# Altium integrated library ALTIUM-WR-FPC-rev18c.IntLib: 212 symbols (part 1 of 2) (continued)
## 686124183822 (continued)
SMT ZIF Connectors WR-FPC, Vertical, Type A, pitch 1 mm, 24 pins; Part Number: 686124183822; Rated Current: 1 A; Contact Resistance: 30 mOhm; Withstanding Voltage: 250 VAC; Working Voltage: 125 VAC; Pin Number: 24; Pitch: 1 mm; Contact Design: Type A; ComponentLink1Description: Manufacturer; ComponentLink1URL: http://www.we-online.de; ComponentLink2Description: Datasheet; ComponentLink2URL: https://katalog.we-online.de/em/datasheet/686124183822.pdf; Published Date: August 2018; Publisher: Wurth Elektronik; Operating Temperature: -25 to 85 degC; Packaging: Tape and Reel; Mounting Technology: SMT; Orientation: Vertical
footprint 686124183822
pins: 1, 2, 3, 4, 5, 6, 7, 8, 9, 10, 11, 12, 13, 14, 15, 16, 17, 18, 19, 20, 21, 22, 23, 24, MP1, MP2, MP3, MP4

## 686126148922
designator J?
SMT ZIF Connectors Hinge Type WR-FPC, Horizontal, Bottom Contact, pitch 1 mm, 26 pins; Part Number: 686126148922; Rated Current: 1 A; Contact Resistance: 50 mOhm; Withstanding Voltage: 500 VAC; Working Voltage: 100 VAC; Pin Number: 26; Pitch: 1 mm; ComponentLink1Description: Manufacturer; ComponentLink1URL: http://www.we-online.de; ComponentLink2Description: Datasheet; ComponentLink2URL: https://katalog.we-online.de/em/datasheet/686126148922.pdf; Published Date: August 2018; Publisher: Wurth Elektronik; Operating Temperature: -40 to 105 degC; Packaging: Tape and Reel; Mounting Technology: SMT; Orientation: Horizontal; Contact Design: Bottom Contact
footprint 686126148922
pins: 1, 2, 3, 4, 5, 6, 7, 8, 9, 10, 11, 12, 13, 14, 15, 16, 17, 18, 19, 20, 21, 22, 23, 24, 25, 26, MP1, MP2

## 686128148922
designator J?
SMT ZIF Connectors Hinge Type WR-FPC, Horizontal, Bottom Contact, pitch 1 mm, 28 pins; Part Number: 686128148922; Rated Current: 1 A; Contact Resistance: 50 mOhm; Withstanding Voltage: 500 VAC; Working Voltage: 100 VAC; Pin Number: 28; Pitch: 1 mm; ComponentLink1Description: Manufacturer; ComponentLink1URL: http://www.we-online.de; ComponentLink2Description: Datasheet; ComponentLink2URL: https://katalog.we-online.de/em/datasheet/686128148922.pdf; Published Date: August 2018; Publisher: Wurth Elektronik; Operating Temperature: -40 to 105 degC; Packaging: Tape and Reel; Mounting Technology: SMT; Orientation: Horizontal; Contact Design: Bottom Contact
footprint 686128148922
pins: 1, 2, 3, 4, 5, 6, 7, 8, 9, 10, 11, 12, 13, 14, 15, 16, 17, 18, 19, 20, 21, 22, 23, 24, 25, 26, 27, 28, MP1, MP2

## 686130148922
designator J?
SMT ZIF Connectors Hinge Type WR-FPC, Horizontal, Bottom Contact, pitch 1 mm, 30 pins; Part Number: 686130148922; Rated Current: 1 A; Contact Resistance: 50 mOhm; Withstanding Voltage: 500 VAC; Working Voltage: 100 VAC; Pin Number: 30; Pitch: 1 mm; ComponentLink1Description: Manufacturer; ComponentLink1URL: http://www.we-online.de; ComponentLink2Description: Datasheet; ComponentLink2URL: https://katalog.we-online.de/em/datasheet/686130148922.pdf; Published Date: August 2018; Publisher: Wurth Elektronik; Operating Temperature: -40 to 105 degC; Packaging: Tape and Reel; Mounting Technology: SMT; Orientation: Horizontal; Contact Design: Bottom Contact
footprint 686130148922
pins: 1, 2, 3, 4, 5, 6, 7, 8, 9, 10, 11, 12, 13, 14, 15, 16, 17, 18, 19, 20, 21, 22, 23, 24, 25, 26, 27, 28, 29, 30, MP1, MP2


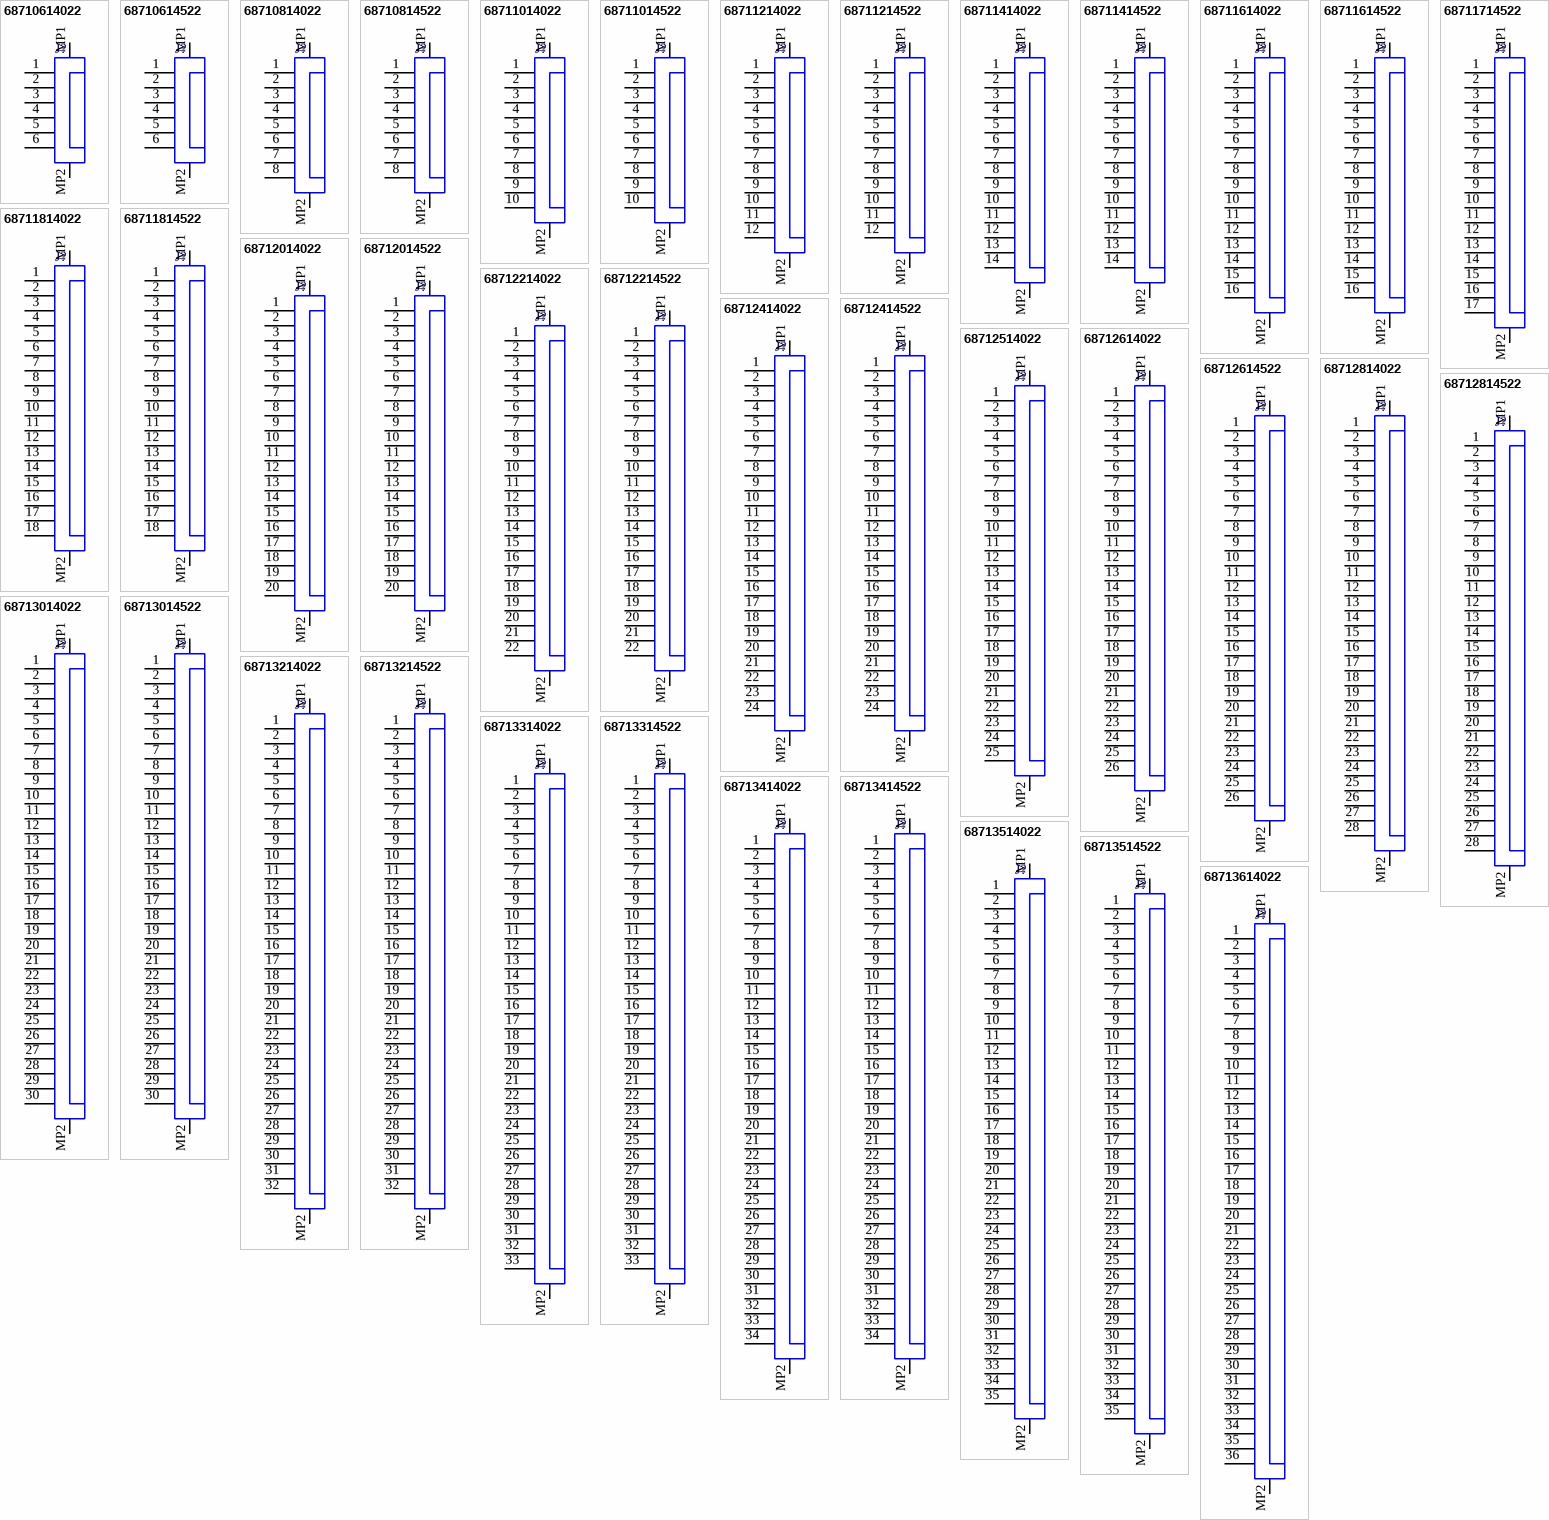
[diagram p2: symbols 68710614022 to 68713614022]

## 68710614022
designator J?
SMT ZIF Connectors WR-FPC, Horizontal, Top Contact, pitch 0.5 mm, 6 pins; Part Number: 68710614022; Rated Current: 0.5 A; Contact Resistance: 20 mOhm; Withstanding Voltage: 250 VAC; Working Voltage: 50 VAC; Pin Number: 6; Pitch: 0.5 mm; ComponentLink1Description: Manufacturer; ComponentLink1URL: http://www.we-online.de; ComponentLink2Description: Datasheet; ComponentLink2URL: https://katalog.we-online.de/em/datasheet/68710614022.pdf; Published Date: August 2018; Publisher: Wurth Elektronik; Operating Temperature: -25 to 85 degC; Packaging: Tape and Reel; Mounting Technology: SMT; Orientation: Horizontal; Contact Design: Top Contact
footprint 68710614022
pins: 1, 2, 3, 4, 5, 6, MP1, MP2

## 68710614522
designator J?
SMT ZIF Connectors WR-FPC, Horizontal, Bottom Contact, pitch 0.5 mm, 6 pins; Part Number: 68710614522; Rated Current: 0.5 A; Contact Resistance: 20 mOhm; Withstanding Voltage: 250 VAC; Working Voltage: 50 VAC; Pin Number: 6; Pitch: 0.5 mm; ComponentLink1Description: Manufacturer; ComponentLink1URL: http://www.we-online.de; ComponentLink2Description: Datasheet; ComponentLink2URL: https://katalog.we-online.de/em/datasheet/68710614522.pdf; Published Date: August 2018; Publisher: Wurth Elektronik; Operating Temperature: -25 to 85 degC; Packaging: Tape and Reel; Mounting Technology: SMT; Orientation: Horizontal; Contact Design: Bottom Contact
footprint 68710614522
pins: 1, 2, 3, 4, 5, 6, MP1, MP2

## 68710814022
designator J?
SMT ZIF Connectors WR-FPC, Horizontal, Top Contact, pitch 0.5 mm, 8 pins; Part Number: 68710814022; Rated Current: 0.5 A; Contact Resistance: 20 mOhm; Withstanding Voltage: 250 VAC; Working Voltage: 50 VAC; Pin Number: 8; Pitch: 0.5 mm; ComponentLink1Description: Manufacturer; ComponentLink1URL: http://www.we-online.de; ComponentLink2Description: Datasheet; ComponentLink2URL: https://katalog.we-online.de/em/datasheet/68710814022.pdf; Published Date: August 2018; Publisher: Wurth Elektronik; Operating Temperature: -25 to 85 degC; Packaging: Tape and Reel; Mounting Technology: SMT; Orientation: Horizontal; Contact Design: Top Contact
footprint 68710814022
pins: 1, 2, 3, 4, 5, 6, 7, 8, MP1, MP2

## 68710814522
designator J?
SMT ZIF Connectors WR-FPC, Horizontal, Bottom Contact, pitch 0.5 mm, 8 pins; Part Number: 68710814522; Rated Current: 0.5 A; Contact Resistance: 20 mOhm; Withstanding Voltage: 250 VAC; Working Voltage: 50 VAC; Pin Number: 8; Pitch: 0.5 mm; ComponentLink1Description: Manufacturer; ComponentLink1URL: http://www.we-online.de; ComponentLink2Description: Datasheet; ComponentLink2URL: https://katalog.we-online.de/em/datasheet/68710814522.pdf; Published Date: August 2018; Publisher: Wurth Elektronik; Operating Temperature: -25 to 85 degC; Packaging: Tape and Reel; Mounting Technology: SMT; Orientation: Horizontal; Contact Design: Bottom Contact
footprint 68710814522
pins: 1, 2, 3, 4, 5, 6, 7, 8, MP1, MP2

## 68711014022
designator J?
SMT ZIF Connectors WR-FPC, Horizontal, Top Contact, pitch 0.5 mm, 10 pins; Part Number: 68711014022; Rated Current: 0.5 A; Contact Resistance: 20 mOhm; Withstanding Voltage: 250 VAC; Working Voltage: 50 VAC; Pin Number: 10; Pitch: 0.5 mm; ComponentLink1Description: Manufacturer; ComponentLink1URL: http://www.we-online.de; ComponentLink2Description: Datasheet; ComponentLink2URL: https://katalog.we-online.de/em/datasheet/68711014022.pdf; Published Date: August 2018; Publisher: Wurth Elektronik; Operating Temperature: -25 to 85 degC; Packaging: Tape and Reel; Mounting Technology: SMT; Orientation: Horizontal; Contact Design: Top Contact
footprint 68711014022
pins: 1, 2, 3, 4, 5, 6, 7, 8, 9, 10, MP1, MP2

## 68711014522
designator J?
SMT ZIF Connectors WR-FPC, Horizontal, Bottom Contact, pitch 0.5 mm, 10 pins; Part Number: 68711014522; Rated Current: 0.5 A; Contact Resistance: 20 mOhm; Withstanding Voltage: 250 VAC; Working Voltage: 50 VAC; Pin Number: 10; Pitch: 0.5 mm; ComponentLink1Description: Manufacturer; ComponentLink1URL: http://www.we-online.de; ComponentLink2Description: Datasheet; ComponentLink2URL: https://katalog.we-online.de/em/datasheet/68711014522.pdf; Published Date: August 2018; Publisher: Wurth Elektronik; Operating Temperature: -25 to 85 degC; Packaging: Tape and Reel; Mounting Technology: SMT; Orientation: Horizontal; Contact Design: Bottom Contact
footprint 68711014522
pins: 1, 2, 3, 4, 5, 6, 7, 8, 9, 10, MP1, MP2

## 68711214022
designator J?
SMT ZIF Connectors WR-FPC, Horizontal, Top Contact, pitch 0.5 mm, 12 pins; Part Number: 68711214022; Rated Current: 0.5 A; Contact Resistance: 20 mOhm; Withstanding Voltage: 250 VAC; Working Voltage: 50 VAC; Pin Number: 12; Pitch: 0.5 mm; ComponentLink1Description: Manufacturer; ComponentLink1URL: http://www.we-online.de; ComponentLink2Description: Datasheet; ComponentLink2URL: https://katalog.we-online.de/em/datasheet/68711214022.pdf; Published Date: August 2018; Publisher: Wurth Elektronik; Operating Temperature: -25 to 85 degC; Packaging: Tape and Reel; Mounting Technology: SMT; Orientation: Horizontal; Contact Design: Top Contact
footprint 68711214022
pins: 1, 2, 3, 4, 5, 6, 7, 8, 9, 10, 11, 12, MP1, MP2

## 68711214522
designator J?
SMT ZIF Connectors WR-FPC, Horizontal, Bottom Contact, pitch 0.5 mm, 12 pins; Part Number: 68711214522; Rated Current: 0.5 A; Contact Resistance: 20 mOhm; Withstanding Voltage: 250 VAC; Working Voltage: 50 VAC; Pin Number: 12; Pitch: 0.5 mm; ComponentLink1Description: Manufacturer; ComponentLink1URL: http://www.we-online.de; ComponentLink2Description: Datasheet; ComponentLink2URL: https://katalog.we-online.de/em/datasheet/68711214522.pdf; Published Date: August 2018; Publisher: Wurth Elektronik; Operating Temperature: -25 to 85 degC; Packaging: Tape and Reel; Mounting Technology: SMT; Orientation: Horizontal; Contact Design: Bottom Contact
footprint 68711214522
pins: 1, 2, 3, 4, 5, 6, 7, 8, 9, 10, 11, 12, MP1, MP2

## 68711414022
designator J?
SMT ZIF Connectors WR-FPC, Horizontal, Top Contact, pitch 0.5 mm, 14 pins; Part Number: 68711414022; Rated Current: 0.5 A; Contact Resistance: 20 mOhm; Withstanding Voltage: 250 VAC; Working Voltage: 50 VAC; Pin Number: 14; Pitch: 0.5 mm; ComponentLink1Description: Manufacturer; ComponentLink1URL: http://www.we-online.de; ComponentLink2Description: Datasheet; ComponentLink2URL: https://katalog.we-online.de/em/datasheet/68711414022.pdf; Published Date: August 2018; Publisher: Wurth Elektronik; Operating Temperature: -25 to 85 degC; Packaging: Tape and Reel; Mounting Technology: SMT; Orientation: Horizontal; Contact Design: Top Contact
footprint 68711414022
pins: 1, 2, 3, 4, 5, 6, 7, 8, 9, 10, 11, 12, 13, 14, MP1, MP2

## 68711414522
designator J?
SMT ZIF Connectors WR-FPC, Horizontal, Bottom Contact, pitch 0.5 mm, 14 pins; Part Number: 68711414522; Rated Current: 0.5 A; Contact Resistance: 20 mOhm; Withstanding Voltage: 250 VAC; Working Voltage: 50 VAC; Pin Number: 14; Pitch: 0.5 mm; ComponentLink1Description: Manufacturer; ComponentLink1URL: http://www.we-online.de; ComponentLink2Description: Datasheet; ComponentLink2URL: https://katalog.we-online.de/em/datasheet/68711414522.pdf; Published Date: August 2018; Publisher: Wurth Elektronik; Operating Temperature: -25 to 85 degC; Packaging: Tape and Reel; Mounting Technology: SMT; Orientation: Horizontal; Contact Design: Bottom Contact
footprint 68711414522
pins: 1, 2, 3, 4, 5, 6, 7, 8, 9, 10, 11, 12, 13, 14, MP1, MP2

## 68711614022
designator J?
SMT ZIF Connectors WR-FPC, Horizontal, Top Contact, pitch 0.5 mm, 16 pins; Part Number: 68711614022; Rated Current: 0.5 A; Contact Resistance: 20 mOhm; Withstanding Voltage: 250 VAC; Working Voltage: 50 VAC; Pin Number: 16; Pitch: 0.5 mm; ComponentLink1Description: Manufacturer; ComponentLink1URL: http://www.we-online.de; ComponentLink2Description: Datasheet; ComponentLink2URL: https://katalog.we-online.de/em/datasheet/68711614022.pdf; Published Date: August 2018; Publisher: Wurth Elektronik; Operating Temperature: -25 to 85 degC; Packaging: Tape and Reel; Mounting Technology: SMT; Orientation: Horizontal; Contact Design: Top Contact
footprint 68711614022
pins: 1, 2, 3, 4, 5, 6, 7, 8, 9, 10, 11, 12, 13, 14, 15, 16, MP1, MP2

## 68711614522
designator J?
SMT ZIF Connectors WR-FPC, Horizontal, Bottom Contact, pitch 0.5 mm, 16 pins; Part Number: 68711614522; Rated Current: 0.5 A; Contact Resistance: 20 mOhm; Withstanding Voltage: 250 VAC; Working Voltage: 50 VAC; Pin Number: 16; Pitch: 0.5 mm; ComponentLink1Description: Manufacturer; ComponentLink1URL: http://www.we-online.de; ComponentLink2Description: Datasheet; ComponentLink2URL: https://katalog.we-online.de/em/datasheet/68711614522.pdf; Published Date: August 2018; Publisher: Wurth Elektronik; Operating Temperature: -25 to 85 degC; Packaging: Tape and Reel; Mounting Technology: SMT; Orientation: Horizontal; Contact Design: Bottom Contact
footprint 68711614522
pins: 1, 2, 3, 4, 5, 6, 7, 8, 9, 10, 11, 12, 13, 14, 15, 16, MP1, MP2

## 68711714522
designator J?
SMT ZIF Connectors WR-FPC, Horizontal, Bottom Contact, pitch 0.5 mm, 17 pins; Part Number: 68711714522; Rated Current: 0.5 A; Contact Resistance: 20 mOhm; Withstanding Voltage: 250 VAC; Working Voltage: 50 VAC; Pin Number: 17; Pitch: 0.5 mm; ComponentLink1Description: Manufacturer; ComponentLink1URL: http://www.we-online.de; ComponentLink2Description: Datasheet; ComponentLink2URL: https://katalog.we-online.de/em/datasheet/68711714522.pdf; Published Date: August 2018; Publisher: Wurth Elektronik; Operating Temperature: -25 to 85 degC; Packaging: Tape and Reel; Mounting Technology: SMT; Orientation: Horizontal; Contact Design: Bottom Contact
footprint 68711714522
pins: 1, 2, 3, 4, 5, 6, 7, 8, 9, 10, 11, 12, 13, 14, 15, 16, 17, MP1, MP2

## 68711814022
designator J?
SMT ZIF Connectors WR-FPC, Horizontal, Top Contact, pitch 0.5 mm, 18 pins; Part Number: 68711814022; Rated Current: 0.5 A; Contact Resistance: 20 mOhm; Withstanding Voltage: 250 VAC; Working Voltage: 50 VAC; Pin Number: 18; Pitch: 0.5 mm; ComponentLink1Description: Manufacturer; ComponentLink1URL: http://www.we-online.de; ComponentLink2Description: Datasheet; ComponentLink2URL: https://katalog.we-online.de/em/datasheet/68711814022.pdf; Published Date: August 2018; Publisher: Wurth Elektronik; Operating Temperature: -25 to 85 degC; Packaging: Tape and Reel; Mounting Technology: SMT; Orientation: Horizontal; Contact Design: Top Contact
footprint 68711814022
pins: 1, 2, 3, 4, 5, 6, 7, 8, 9, 10, 11, 12, 13, 14, 15, 16, 17, 18, MP1, MP2

## 68711814522
designator J?
SMT ZIF Connectors WR-FPC, Horizontal, Bottom Contact, pitch 0.5 mm, 18 pins; Part Number: 68711814522; Rated Current: 0.5 A; Contact Resistance: 20 mOhm; Withstanding Voltage: 250 VAC; Working Voltage: 50 VAC; Pin Number: 18; Pitch: 0.5 mm; ComponentLink1Description: Manufacturer; ComponentLink1URL: http://www.we-online.de; ComponentLink2Description: Datasheet; ComponentLink2URL: https://katalog.we-online.de/em/datasheet/68711814522.pdf; Published Date: August 2018; Publisher: Wurth Elektronik; Operating Temperature: -25 to 85 degC; Packaging: Tape and Reel; Mounting Technology: SMT; Orientation: Horizontal; Contact Design: Bottom Contact
footprint 68711814522
pins: 1, 2, 3, 4, 5, 6, 7, 8, 9, 10, 11, 12, 13, 14, 15, 16, 17, 18, MP1, MP2

## 68712014022
designator J?
SMT ZIF Connectors WR-FPC, Horizontal, Top Contact, pitch 0.5 mm, 20 pins; Part Number: 68712014022; Rated Current: 0.5 A; Contact Resistance: 20 mOhm; Withstanding Voltage: 250 VAC; Working Voltage: 50 VAC; Pin Number: 20; Pitch: 0.5 mm; ComponentLink1Description: Manufacturer; ComponentLink1URL: http://www.we-online.de; ComponentLink2Description: Datasheet; ComponentLink2URL: https://katalog.we-online.de/em/datasheet/68712014022.pdf; Published Date: August 2018; Publisher: Wurth Elektronik; Operating Temperature: -25 to 85 degC; Packaging: Tape and Reel; Mounting Technology: SMT; Orientation: Horizontal; Contact Design: Top Contact
footprint 68712014022
pins: 1, 2, 3, 4, 5, 6, 7, 8, 9, 10, 11, 12, 13, 14, 15, 16, 17, 18, 19, 20, MP1, MP2

## 68712014522
designator J?
SMT ZIF Connectors WR-FPC, Horizontal, Bottom Contact, pitch 0.5 mm, 20 pins; Part Number: 68712014522; Rated Current: 0.5 A; Contact Resistance: 20 mOhm; Withstanding Voltage: 250 VAC; Working Voltage: 50 VAC; Pin Number: 20; Pitch: 0.5 mm; ComponentLink1Description: Manufacturer; ComponentLink1URL: http://www.we-online.de; ComponentLink2Description: Datasheet; ComponentLink2URL: https://katalog.we-online.de/em/datasheet/68712014522.pdf; Published Date: August 2018; Publisher: Wurth Elektronik; Operating Temperature: -25 to 85 degC; Packaging: Tape and Reel; Mounting Technology: SMT; Orientation: Horizontal; Contact Design: Bottom Contact
footprint 68712014522
pins: 1, 2, 3, 4, 5, 6, 7, 8, 9, 10, 11, 12, 13, 14, 15, 16, 17, 18, 19, 20, MP1, MP2

## 68712214022
designator J?
SMT ZIF Connectors WR-FPC, Horizontal, Top Contact, pitch 0.5 mm, 22 pins; Part Number: 68712214022; Rated Current: 0.5 A; Contact Resistance: 20 mOhm; Withstanding Voltage: 250 VAC; Working Voltage: 50 VAC; Pin Number: 22; Pitch: 0.5 mm; ComponentLink1Description: Manufacturer; ComponentLink1URL: http://www.we-online.de; ComponentLink2Description: Datasheet; ComponentLink2URL: https://katalog.we-online.de/em/datasheet/68712214022.pdf; Published Date: August 2018; Publisher: Wurth Elektronik; Operating Temperature: -25 to 85 degC; Packaging: Tape and Reel; Mounting Technology: SMT; Orientation: Horizontal; Contact Design: Top Contact
footprint 68712214022
pins: 1, 2, 3, 4, 5, 6, 7, 8, 9, 10, 11, 12, 13, 14, 15, 16, 17, 18, 19, 20, 21, 22, MP1, MP2

## 68712214522
designator J?
SMT ZIF Connectors WR-FPC, Horizontal, Bottom Contact, pitch 0.5 mm, 22 pins; Part Number: 68712214522; Rated Current: 0.5 A; Contact Resistance: 20 mOhm; Withstanding Voltage: 250 VAC; Working Voltage: 50 VAC; Pin Number: 22; Pitch: 0.5 mm; ComponentLink1Description: Manufacturer; ComponentLink1URL: http://www.we-online.de; ComponentLink2Description: Datasheet; ComponentLink2URL: https://katalog.we-online.de/em/datasheet/68712214522.pdf; Published Date: August 2018; Publisher: Wurth Elektronik; Operating Temperature: -25 to 85 degC; Packaging: Tape and Reel; Mounting Technology: SMT; Orientation: Horizontal; Contact Design: Bottom Contact
footprint 68712214522
pins: 1, 2, 3, 4, 5, 6, 7, 8, 9, 10, 11, 12, 13, 14, 15, 16, 17, 18, 19, 20, 21, 22, MP1, MP2

## 68712414022
designator J?
SMT ZIF Connectors WR-FPC, Horizontal, Top Contact, pitch 0.5 mm, 24 pins; Part Number: 68712414022; Rated Current: 0.5 A; Contact Resistance: 20 mOhm; Withstanding Voltage: 250 VAC; Working Voltage: 50 VAC; Pin Number: 24; Pitch: 0.5 mm; ComponentLink1Description: Manufacturer; ComponentLink1URL: http://www.we-online.de; ComponentLink2Description: Datasheet; ComponentLink2URL: https://katalog.we-online.de/em/datasheet/68712414022.pdf; Published Date: August 2018; Publisher: Wurth Elektronik; Operating Temperature: -25 to 85 degC; Packaging: Tape and Reel; Mounting Technology: SMT; Orientation: Horizontal; Contact Design: Top Contact
footprint 68712414022
pins: 1, 2, 3, 4, 5, 6, 7, 8, 9, 10, 11, 12, 13, 14, 15, 16, 17, 18, 19, 20, 21, 22, 23, 24, MP1, MP2

## 68712414522
designator J?
SMT ZIF Connectors WR-FPC, Horizontal, Bottom Contact, pitch 0.5 mm, 24 pins; Part Number: 68712414522; Rated Current: 0.5 A; Contact Resistance: 20 mOhm; Withstanding Voltage: 250 VAC; Working Voltage: 50 VAC; Pin Number: 24; Pitch: 0.5 mm; ComponentLink1Description: Manufacturer; ComponentLink1URL: http://www.we-online.de; ComponentLink2Description: Datasheet; ComponentLink2URL: https://katalog.we-online.de/em/datasheet/68712414522.pdf; Published Date: August 2018; Publisher: Wurth Elektronik; Operating Temperature: -25 to 85 degC; Packaging: Tape and Reel; Mounting Technology: SMT; Orientation: Horizontal; Contact Design: Bottom Contact
footprint 68712414522
pins: 1, 2, 3, 4, 5, 6, 7, 8, 9, 10, 11, 12, 13, 14, 15, 16, 17, 18, 19, 20, 21, 22, 23, 24, MP1, MP2

## 68712514022
designator J?
SMT ZIF Connectors WR-FPC, Horizontal, Top Contact, pitch 0.5 mm, 25 pins; Part Number: 68712514022; Rated Current: 0.5 A; Contact Resistance: 20 mOhm; Withstanding Voltage: 250 VAC; Working Voltage: 50 VAC; Pin Number: 25; Pitch: 0.5 mm; ComponentLink1Description: Manufacturer; ComponentLink1URL: http://www.we-online.de; ComponentLink2Description: Datasheet; ComponentLink2URL: https://katalog.we-online.de/em/datasheet/68712514022.pdf; Published Date: August 2018; Publisher: Wurth Elektronik; Operating Temperature: -25 to 85 degC; Packaging: Tape and Reel; Mounting Technology: SMT; Orientation: Horizontal; Contact Design: Top Contact
footprint 68712514022
pins: 1, 2, 3, 4, 5, 6, 7, 8, 9, 10, 11, 12, 13, 14, 15, 16, 17, 18, 19, 20, 21, 22, 23, 24, 25, MP1, MP2

## 68712614022
designator J?
SMT ZIF Connectors WR-FPC, Horizontal, Top Contact, pitch 0.5 mm, 26 pins; Part Number: 68712614022; Rated Current: 0.5 A; Contact Resistance: 20 mOhm; Withstanding Voltage: 250 VAC; Working Voltage: 50 VAC; Pin Number: 26; Pitch: 0.5 mm; ComponentLink1Description: Manufacturer; ComponentLink1URL: http://www.we-online.de; ComponentLink2Description: Datasheet; ComponentLink2URL: https://katalog.we-online.de/em/datasheet/68712614022.pdf; Published Date: August 2018; Publisher: Wurth Elektronik; Operating Temperature: -25 to 85 degC; Packaging: Tape and Reel; Mounting Technology: SMT; Orientation: Horizontal; Contact Design: Top Contact
footprint 68712614022
pins: 1, 2, 3, 4, 5, 6, 7, 8, 9, 10, 11, 12, 13, 14, 15, 16, 17, 18, 19, 20, 21, 22, 23, 24, 25, 26, MP1, MP2

## 68712614522
designator J?
SMT ZIF Connectors WR-FPC, Horizontal, Bottom Contact, pitch 0.5 mm, 26 pins; Part Number: 68712614522; Rated Current: 0.5 A; Contact Resistance: 20 mOhm; Withstanding Voltage: 250 VAC; Working Voltage: 50 VAC; Pin Number: 26; Pitch: 0.5 mm; ComponentLink1Description: Manufacturer; ComponentLink1URL: http://www.we-online.de; ComponentLink2Description: Datasheet; ComponentLink2URL: https://katalog.we-online.de/em/datasheet/68712614522.pdf; Published Date: August 2018; Publisher: Wurth Elektronik; Operating Temperature: -25 to 85 degC; Packaging: Tape and Reel; Mounting Technology: SMT; Orientation: Horizontal; Contact Design: Bottom Contact
footprint 68712614522
pins: 1, 2, 3, 4, 5, 6, 7, 8, 9, 10, 11, 12, 13, 14, 15, 16, 17, 18, 19, 20, 21, 22, 23, 24, 25, 26, MP1, MP2

## 68712814022
designator J?
SMT ZIF Connectors WR-FPC, Horizontal, Top Contact, pitch 0.5 mm, 28 pins; Part Number: 68712814022; Rated Current: 0.5 A; Contact Resistance: 20 mOhm; Withstanding Voltage: 250 VAC; Working Voltage: 50 VAC; Pin Number: 28; Pitch: 0.5 mm; ComponentLink1Description: Manufacturer; ComponentLink1URL: http://www.we-online.de; ComponentLink2Description: Datasheet; ComponentLink2URL: https://katalog.we-online.de/em/datasheet/68712814022.pdf; Published Date: August 2018; Publisher: Wurth Elektronik; Operating Temperature: -25 to 85 degC; Packaging: Tape and Reel; Mounting Technology: SMT; Orientation: Horizontal; Contact Design: Top Contact
footprint 68712814022
pins: 1, 2, 3, 4, 5, 6, 7, 8, 9, 10, 11, 12, 13, 14, 15, 16, 17, 18, 19, 20, 21, 22, 23, 24, 25, 26, 27, 28, MP1, MP2

## 68712814522
designator J?
SMT ZIF Connectors WR-FPC, Horizontal, Bottom Contact, pitch 0.5 mm, 28 pins; Part Number: 68712814522; Rated Current: 0.5 A; Contact Resistance: 20 mOhm; Withstanding Voltage: 250 VAC; Working Voltage: 50 VAC; Pin Number: 28; Pitch: 0.5 mm; ComponentLink1Description: Manufacturer; ComponentLink1URL: http://www.we-online.de; ComponentLink2Description: Datasheet; ComponentLink2URL: https://katalog.we-online.de/em/datasheet/68712814522.pdf; Published Date: August 2018; Publisher: Wurth Elektronik; Operating Temperature: -25 to 85 degC; Packaging: Tape and Reel; Mounting Technology: SMT; Orientation: Horizontal; Contact Design: Bottom Contact
footprint 68712814522
pins: 1, 2, 3, 4, 5, 6, 7, 8, 9, 10, 11, 12, 13, 14, 15, 16, 17, 18, 19, 20, 21, 22, 23, 24, 25, 26, 27, 28, MP1, MP2

## 68713014022
designator J?
SMT ZIF Connectors WR-FPC, Horizontal, Top Contact, pitch 0.5 mm, 30 pins; Part Number: 68713014022; Rated Current: 0.5 A; Contact Resistance: 20 mOhm; Withstanding Voltage: 250 VAC; Working Voltage: 50 VAC; Pin Number: 30; Pitch: 0.5 mm; ComponentLink1Description: Manufacturer; ComponentLink1URL: http://www.we-online.de; ComponentLink2Description: Datasheet; ComponentLink2URL: https://katalog.we-online.de/em/datasheet/68713014022.pdf; Published Date: August 2018; Publisher: Wurth Elektronik; Operating Temperature: -25 to 85 degC; Packaging: Tape and Reel; Mounting Technology: SMT; Orientation: Horizontal; Contact Design: Top Contact
footprint 68713014022
pins: 1, 2, 3, 4, 5, 6, 7, 8, 9, 10, 11, 12, 13, 14, 15, 16, 17, 18, 19, 20, 21, 22, 23, 24, 25, 26, 27, 28, 29, 30, MP1, MP2
